# Altium footprint library con-samtec.PCBLIB: 805 footprints (part 7 of 55)
Each footprint in its own frame and in the unit in brackets; x right, y up, seen from the top. Pads: shape width x height; smd on the part's side, far side on the other; paste and mask are expansions set on the pad; w line width, h text height; cw(c..) or ccw(c..) is an arc to the next point about the centre after c.
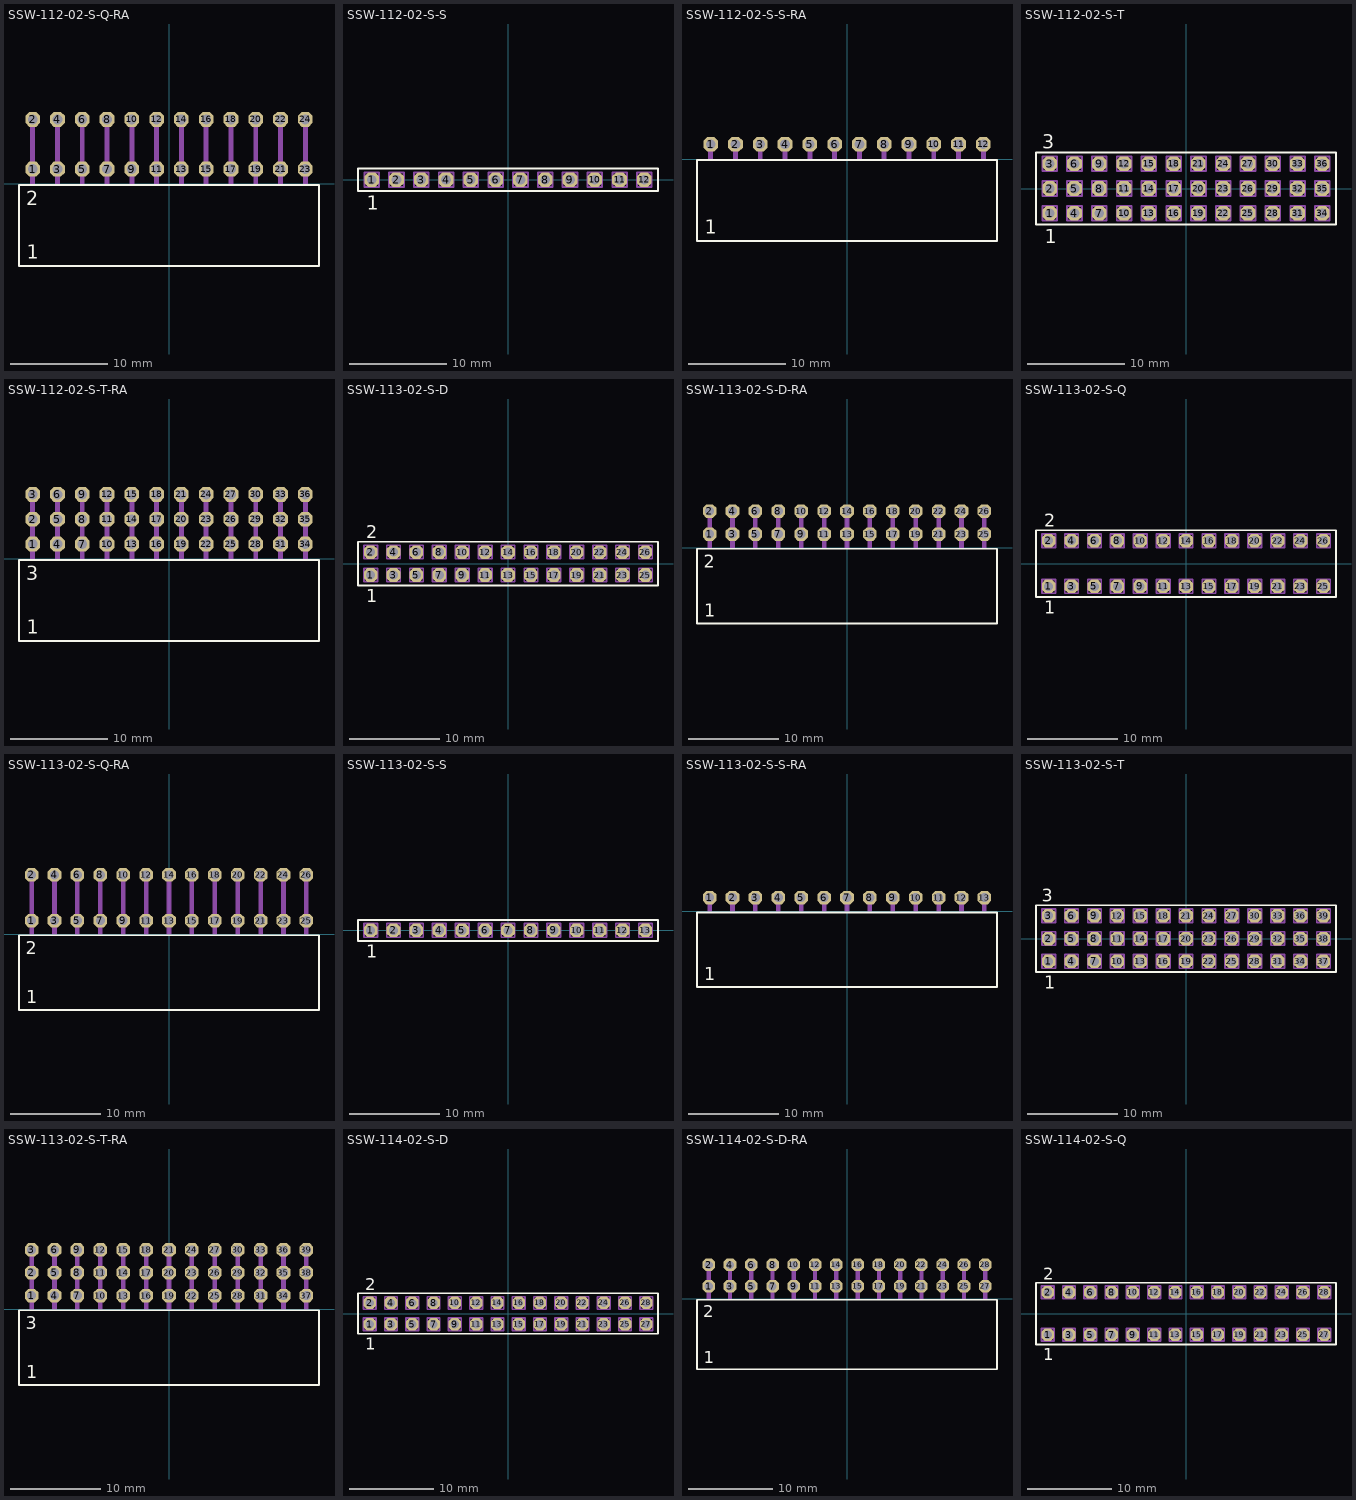
[diagram p6: the footprints below, top view; thin cyan lines are the x and y axes]

## SSW-112-02-S-Q-RA [mil]
pads (24):
  oct 59.06x59.06 hole 39.37: 1(-550,60) 2(-550,260) 3(-450,60) 4(-450,260) 5(-350,60) 6(-350,260) 7(-250,60) 8(-250,260) 9(-150,60) 10(-150,260) 11(-50,60) 12(-50,260) 13(50,60) 14(50,260) 15(150,60) 16(150,260) 17(250,60) 18(250,260) 19(350,60) 20(350,260) 21(450,60) 22(450,260) 23(550,60) 24(550,260)
Top Overlay:
  lines w8: -605.08,-330.55 605.08,-330.55 605.08,-4.17 -605.08,-4.17 -605.08,-330.55
  text "1" at -573.43,-301.18 h56.1
  text "2" at -576.38,-86.61 h56.1
Mechanical 16:
  rectangle: -560,0 -540,270
  rectangle: -460,0 -440,270
  rectangle: -360,0 -340,270
  rectangle: -260,0 -240,270
  rectangle: -160,0 -140,270
  rectangle: -60,0 -40,270
  rectangle: 40,0 60,270
  rectangle: 140,0 160,270
  rectangle: 240,0 260,270
  rectangle: 340,0 360,270
  rectangle: 440,0 460,270
  rectangle: 540,0 560,270

## SSW-112-02-S-S [mm]
pads (12):
  oct 1.5x1.5 hole 1: 1(-13.97,0) 2(-11.43,0) 3(-8.89,0) 4(-6.35,0) 5(-3.81,0) 6(-1.27,0) 7(1.27,0) 8(3.81,0) 9(6.35,0) 10(8.89,0) 11(11.43,0) 12(13.97,0)
Top Overlay:
  lines w0.203: -15.369,-1.155 15.369,-1.155 15.369,1.155 -15.369,1.155 -15.369,-1.155
  text "1" at -14.478,-3.048 h1.42
Mechanical 16:
  lines w0.203: -14.715,-0.745 -13.215,-0.745 -13.215,0.755 -14.715,0.755 -14.715,-0.745 ; -12.175,-0.745 -10.675,-0.745 -10.675,0.755 -12.175,0.755 -12.175,-0.745 ; -9.635,-0.745 -8.135,-0.745 -8.135,0.755 -9.635,0.755 -9.635,-0.745 ; -7.095,-0.745 -5.595,-0.745 -5.595,0.755 -7.095,0.755 -7.095,-0.745 ; -4.555,-0.745 -3.055,-0.745 -3.055,0.755 -4.555,0.755 -4.555,-0.745 ; -2.015,-0.745 -0.515,-0.745 -0.515,0.755 -2.015,0.755 -2.015,-0.745 ; 0.525,-0.745 2.025,-0.745 2.025,0.755 0.525,0.755 0.525,-0.745 ; 3.065,-0.745 4.565,-0.745 4.565,0.755 3.065,0.755 3.065,-0.745 ; 5.605,-0.745 7.105,-0.745 7.105,0.755 5.605,0.755 5.605,-0.745 ; 8.145,-0.745 9.645,-0.745 9.645,0.755 8.145,0.755 8.145,-0.745 ; 10.685,-0.745 12.185,-0.745 12.185,0.755 10.685,0.755 10.685,-0.745 ; 13.225,-0.745 14.725,-0.745 14.725,0.755 13.225,0.755 13.225,-0.745

## SSW-112-02-S-S-RA [mil]
pads (12):
  oct 59.06x59.06 hole 39.37: 1(-550,60) 2(-450,60) 3(-350,60) 4(-250,60) 5(-150,60) 6(-50,60) 7(50,60) 8(150,60) 9(250,60) 10(350,60) 11(450,60) 12(550,60)
Top Overlay:
  lines w8: -605.08,-330.55 605.08,-330.55 605.08,-4.17 -605.08,-4.17 -605.08,-330.55
  text "1" at -573.43,-301.18 h56.1
Mechanical 16:
  rectangle: -560,0 -540,70
  rectangle: -460,0 -440,70
  rectangle: -360,0 -340,70
  rectangle: -260,0 -240,70
  rectangle: -160,0 -140,70
  rectangle: -60,0 -40,70
  rectangle: 40,0 60,70
  rectangle: 140,0 160,70
  rectangle: 240,0 260,70
  rectangle: 340,0 360,70
  rectangle: 440,0 460,70
  rectangle: 540,0 560,70

## SSW-112-02-S-T [mm]
pads (36):
  oct 1.5x1.5 hole 1: 1(-13.97,-2.54) 2(-13.97,0) 3(-13.97,2.54) 4(-11.43,-2.54) 5(-11.43,0) 6(-11.43,2.54) 7(-8.89,-2.54) 8(-8.89,0) 9(-8.89,2.54) 10(-6.35,-2.54) 11(-6.35,0) 12(-6.35,2.54) 13(-3.81,-2.54) 14(-3.81,0) 15(-3.81,2.54) 16(-1.27,-2.54) 17(-1.27,0) 18(-1.27,2.54) 19(1.27,-2.54) 20(1.27,0) 21(1.27,2.54) 22(3.81,-2.54) 23(3.81,0) 24(3.81,2.54) 25(6.35,-2.54) 26(6.35,0) 27(6.35,2.54) 28(8.89,-2.54) 29(8.89,0) 30(8.89,2.54) 31(11.43,-2.54) 32(11.43,0) 33(11.43,2.54) 34(13.97,-2.54) 35(13.97,0) 36(13.97,2.54)
Top Overlay:
  lines w0.203: -15.369,-3.695 15.369,-3.695 15.369,3.695 -15.369,3.695 -15.369,-3.695
  text "1" at -14.478,-5.588 h1.42
  text "3" at -14.732,4.064 h1.42
Mechanical 16:
  lines w0.203: -14.715,-3.285 -13.215,-3.285 -13.215,-1.785 -14.715,-1.785 -14.715,-3.285 ; -14.715,-0.745 -13.215,-0.745 -13.215,0.755 -14.715,0.755 -14.715,-0.745 ; -14.715,1.795 -13.215,1.795 -13.215,3.295 -14.715,3.295 -14.715,1.795 ; -12.175,-3.285 -10.675,-3.285 -10.675,-1.785 -12.175,-1.785 -12.175,-3.285 ; -12.175,-0.745 -10.675,-0.745 -10.675,0.755 -12.175,0.755 -12.175,-0.745 ; -12.175,1.795 -10.675,1.795 -10.675,3.295 -12.175,3.295 -12.175,1.795 ; -9.635,-3.285 -8.135,-3.285 -8.135,-1.785 -9.635,-1.785 -9.635,-3.285 ; -9.635,-0.745 -8.135,-0.745 -8.135,0.755 -9.635,0.755 -9.635,-0.745 ; -9.635,1.795 -8.135,1.795 -8.135,3.295 -9.635,3.295 -9.635,1.795 ; -7.095,-3.285 -5.595,-3.285 -5.595,-1.785 -7.095,-1.785 -7.095,-3.285 ; -7.095,-0.745 -5.595,-0.745 -5.595,0.755 -7.095,0.755 -7.095,-0.745 ; -7.095,1.795 -5.595,1.795 -5.595,3.295 -7.095,3.295 -7.095,1.795 ; -4.555,-3.285 -3.055,-3.285 -3.055,-1.785 -4.555,-1.785 -4.555,-3.285 ; -4.555,-0.745 -3.055,-0.745 -3.055,0.755 -4.555,0.755 -4.555,-0.745 ; -4.555,1.795 -3.055,1.795 -3.055,3.295 -4.555,3.295 -4.555,1.795 ; -2.015,-3.285 -0.515,-3.285 -0.515,-1.785 -2.015,-1.785 -2.015,-3.285 ; -2.015,-0.745 -0.515,-0.745 -0.515,0.755 -2.015,0.755 -2.015,-0.745 ; -2.015,1.795 -0.515,1.795 -0.515,3.295 -2.015,3.295 -2.015,1.795 ; 0.525,-3.285 2.025,-3.285 2.025,-1.785 0.525,-1.785 0.525,-3.285 ; 0.525,-0.745 2.025,-0.745 2.025,0.755 0.525,0.755 0.525,-0.745 ; 0.525,1.795 2.025,1.795 2.025,3.295 0.525,3.295 0.525,1.795 ; 3.065,-3.285 4.565,-3.285 4.565,-1.785 3.065,-1.785 3.065,-3.285 ; 3.065,-0.745 4.565,-0.745 4.565,0.755 3.065,0.755 3.065,-0.745 ; 3.065,1.795 4.565,1.795 4.565,3.295 3.065,3.295 3.065,1.795 ; 5.605,-3.285 7.105,-3.285 7.105,-1.785 5.605,-1.785 5.605,-3.285 ; 5.605,-0.745 7.105,-0.745 7.105,0.755 5.605,0.755 5.605,-0.745 ; 5.605,1.795 7.105,1.795 7.105,3.295 5.605,3.295 5.605,1.795 ; 8.145,-3.285 9.645,-3.285 9.645,-1.785 8.145,-1.785 8.145,-3.285 ; 8.145,-0.745 9.645,-0.745 9.645,0.755 8.145,0.755 8.145,-0.745 ; 8.145,1.795 9.645,1.795 9.645,3.295 8.145,3.295 8.145,1.795 ; 10.685,-3.285 12.185,-3.285 12.185,-1.785 10.685,-1.785 10.685,-3.285 ; 10.685,-0.745 12.185,-0.745 12.185,0.755 10.685,0.755 10.685,-0.745 ; 10.685,1.795 12.185,1.795 12.185,3.295 10.685,3.295 10.685,1.795 ; 13.225,-3.285 14.725,-3.285 14.725,-1.785 13.225,-1.785 13.225,-3.285 ; 13.225,-0.745 14.725,-0.745 14.725,0.755 13.225,0.755 13.225,-0.745 ; 13.225,1.795 14.725,1.795 14.725,3.295 13.225,3.295 13.225,1.795

## SSW-112-02-S-T-RA [mil]
pads (36):
  oct 59.06x59.06 hole 39.37: 1(-550,60) 2(-550,160) 3(-550,260) 4(-450,60) 5(-450,160) 6(-450,260) 7(-350,60) 8(-350,160) 9(-350,260) 10(-250,60) 11(-250,160) 12(-250,260) 13(-150,60) 14(-150,160) 15(-150,260) 16(-50,60) 17(-50,160) 18(-50,260) 19(50,60) 20(50,160) 21(50,260) 22(150,60) 23(150,160) 24(150,260) 25(250,60) 26(250,160) 27(250,260) 28(350,60) 29(350,160) 30(350,260) 31(450,60) 32(450,160) 33(450,260) 34(550,60) 35(550,160) 36(550,260)
Top Overlay:
  lines w8: -605.08,-330.55 605.08,-330.55 605.08,-4.17 -605.08,-4.17 -605.08,-330.55
  text "1" at -573.43,-301.18 h56.1
  text "3" at -576.38,-86.61 h56.1
Mechanical 16:
  rectangle: -560,0 -540,270
  rectangle: -460,0 -440,270
  rectangle: -360,0 -340,270
  rectangle: -260,0 -240,270
  rectangle: -160,0 -140,270
  rectangle: -60,0 -40,270
  rectangle: 40,0 60,270
  rectangle: 140,0 160,270
  rectangle: 240,0 260,270
  rectangle: 340,0 360,270
  rectangle: 440,0 460,270
  rectangle: 540,0 560,270

## SSW-113-02-S-D [mm]
pads (26):
  oct 1.5x1.5 hole 1: 1(-15.24,-1.27) 2(-15.24,1.27) 3(-12.7,-1.27) 4(-12.7,1.27) 5(-10.16,-1.27) 6(-10.16,1.27) 7(-7.62,-1.27) 8(-7.62,1.27) 9(-5.08,-1.27) 10(-5.08,1.27) 11(-2.54,-1.27) 12(-2.54,1.27) 13(0,-1.27) 14(0,1.27) 15(2.54,-1.27) 16(2.54,1.27) 17(5.08,-1.27) 18(5.08,1.27) 19(7.62,-1.27) 20(7.62,1.27) 21(10.16,-1.27) 22(10.16,1.27) 23(12.7,-1.27) 24(12.7,1.27) 25(15.24,-1.27) 26(15.24,1.27)
Top Overlay:
  lines w0.203: -16.639,-2.425 16.639,-2.425 16.639,2.425 -16.639,2.425 -16.639,-2.425
  text "1" at -15.748,-4.318 h1.42
  text "2" at -15.748,2.794 h1.42
Mechanical 16:
  lines w0.203: -15.985,-2.015 -14.485,-2.015 -14.485,-0.515 -15.985,-0.515 -15.985,-2.015 ; -15.985,0.525 -14.485,0.525 -14.485,2.025 -15.985,2.025 -15.985,0.525 ; -13.445,-2.015 -11.945,-2.015 -11.945,-0.515 -13.445,-0.515 -13.445,-2.015 ; -13.445,0.525 -11.945,0.525 -11.945,2.025 -13.445,2.025 -13.445,0.525 ; -10.905,-2.015 -9.405,-2.015 -9.405,-0.515 -10.905,-0.515 -10.905,-2.015 ; -10.905,0.525 -9.405,0.525 -9.405,2.025 -10.905,2.025 -10.905,0.525 ; -8.365,-2.015 -6.865,-2.015 -6.865,-0.515 -8.365,-0.515 -8.365,-2.015 ; -8.365,0.525 -6.865,0.525 -6.865,2.025 -8.365,2.025 -8.365,0.525 ; -5.825,-2.015 -4.325,-2.015 -4.325,-0.515 -5.825,-0.515 -5.825,-2.015 ; -5.825,0.525 -4.325,0.525 -4.325,2.025 -5.825,2.025 -5.825,0.525 ; -3.285,-2.015 -1.785,-2.015 -1.785,-0.515 -3.285,-0.515 -3.285,-2.015 ; -3.285,0.525 -1.785,0.525 -1.785,2.025 -3.285,2.025 -3.285,0.525 ; -0.745,-2.015 0.755,-2.015 0.755,-0.515 -0.745,-0.515 -0.745,-2.015 ; -0.745,0.525 0.755,0.525 0.755,2.025 -0.745,2.025 -0.745,0.525 ; 1.795,-2.015 3.295,-2.015 3.295,-0.515 1.795,-0.515 1.795,-2.015 ; 1.795,0.525 3.295,0.525 3.295,2.025 1.795,2.025 1.795,0.525 ; 4.335,-2.015 5.835,-2.015 5.835,-0.515 4.335,-0.515 4.335,-2.015 ; 4.335,0.525 5.835,0.525 5.835,2.025 4.335,2.025 4.335,0.525 ; 6.875,-2.015 8.375,-2.015 8.375,-0.515 6.875,-0.515 6.875,-2.015 ; 6.875,0.525 8.375,0.525 8.375,2.025 6.875,2.025 6.875,0.525 ; 9.415,-2.015 10.915,-2.015 10.915,-0.515 9.415,-0.515 9.415,-2.015 ; 9.415,0.525 10.915,0.525 10.915,2.025 9.415,2.025 9.415,0.525 ; 11.955,-2.015 13.455,-2.015 13.455,-0.515 11.955,-0.515 11.955,-2.015 ; 11.955,0.525 13.455,0.525 13.455,2.025 11.955,2.025 11.955,0.525 ; 14.495,-2.015 15.995,-2.015 15.995,-0.515 14.495,-0.515 14.495,-2.015 ; 14.495,0.525 15.995,0.525 15.995,2.025 14.495,2.025 14.495,0.525

## SSW-113-02-S-D-RA [mil]
pads (26):
  oct 59.06x59.06 hole 39.37: 1(-600,60) 2(-600,160) 3(-500,60) 4(-500,160) 5(-400,60) 6(-400,160) 7(-300,60) 8(-300,160) 9(-200,60) 10(-200,160) 11(-100,60) 12(-100,160) 13(0,60) 14(0,160) 15(100,60) 16(100,160) 17(200,60) 18(200,160) 19(300,60) 20(300,160) 21(400,60) 22(400,160) 23(500,60) 24(500,160) 25(600,60) 26(600,160)
Top Overlay:
  lines w8: -655.08,-330.55 655.08,-330.55 655.08,-4.17 -655.08,-4.17 -655.08,-330.55
  text "1" at -623.43,-301.18 h56.1
  text "2" at -626.38,-86.61 h56.1
Mechanical 16:
  rectangle: -610,0 -590,170
  rectangle: -510,0 -490,170
  rectangle: -410,0 -390,170
  rectangle: -310,0 -290,170
  rectangle: -210,0 -190,170
  rectangle: -110,0 -90,170
  rectangle: -10,0 10,170
  rectangle: 90,0 110,170
  rectangle: 190,0 210,170
  rectangle: 290,0 310,170
  rectangle: 390,0 410,170
  rectangle: 490,0 510,170
  rectangle: 590,0 610,170

## SSW-113-02-S-Q [mm]
pads (26):
  oct 1.5x1.5 hole 1: 1(-15.24,-2.54) 2(-15.24,2.54) 3(-12.7,-2.54) 4(-12.7,2.54) 5(-10.16,-2.54) 6(-10.16,2.54) 7(-7.62,-2.54) 8(-7.62,2.54) 9(-5.08,-2.54) 10(-5.08,2.54) 11(-2.54,-2.54) 12(-2.54,2.54) 13(0,-2.54) 14(0,2.54) 15(2.54,-2.54) 16(2.54,2.54) 17(5.08,-2.54) 18(5.08,2.54) 19(7.62,-2.54) 20(7.62,2.54) 21(10.16,-2.54) 22(10.16,2.54) 23(12.7,-2.54) 24(12.7,2.54) 25(15.24,-2.54) 26(15.24,2.54)
Top Overlay:
  lines w0.203: -16.639,-3.695 16.639,-3.695 16.639,3.695 -16.639,3.695 -16.639,-3.695
  text "1" at -15.748,-5.588 h1.42
  text "2" at -15.748,4.064 h1.42
Mechanical 16:
  lines w0.203: -15.985,-3.285 -14.485,-3.285 -14.485,-1.785 -15.985,-1.785 -15.985,-3.285 ; -15.985,1.795 -14.485,1.795 -14.485,3.295 -15.985,3.295 -15.985,1.795 ; -13.445,-3.285 -11.945,-3.285 -11.945,-1.785 -13.445,-1.785 -13.445,-3.285 ; -13.445,1.795 -11.945,1.795 -11.945,3.295 -13.445,3.295 -13.445,1.795 ; -10.905,-3.285 -9.405,-3.285 -9.405,-1.785 -10.905,-1.785 -10.905,-3.285 ; -10.905,1.795 -9.405,1.795 -9.405,3.295 -10.905,3.295 -10.905,1.795 ; -8.365,-3.285 -6.865,-3.285 -6.865,-1.785 -8.365,-1.785 -8.365,-3.285 ; -8.365,1.795 -6.865,1.795 -6.865,3.295 -8.365,3.295 -8.365,1.795 ; -5.825,-3.285 -4.325,-3.285 -4.325,-1.785 -5.825,-1.785 -5.825,-3.285 ; -5.825,1.795 -4.325,1.795 -4.325,3.295 -5.825,3.295 -5.825,1.795 ; -3.285,-3.285 -1.785,-3.285 -1.785,-1.785 -3.285,-1.785 -3.285,-3.285 ; -3.285,1.795 -1.785,1.795 -1.785,3.295 -3.285,3.295 -3.285,1.795 ; -0.745,-3.285 0.755,-3.285 0.755,-1.785 -0.745,-1.785 -0.745,-3.285 ; -0.745,1.795 0.755,1.795 0.755,3.295 -0.745,3.295 -0.745,1.795 ; 1.795,-3.285 3.295,-3.285 3.295,-1.785 1.795,-1.785 1.795,-3.285 ; 1.795,1.795 3.295,1.795 3.295,3.295 1.795,3.295 1.795,1.795 ; 4.335,-3.285 5.835,-3.285 5.835,-1.785 4.335,-1.785 4.335,-3.285 ; 4.335,1.795 5.835,1.795 5.835,3.295 4.335,3.295 4.335,1.795 ; 6.875,-3.285 8.375,-3.285 8.375,-1.785 6.875,-1.785 6.875,-3.285 ; 6.875,1.795 8.375,1.795 8.375,3.295 6.875,3.295 6.875,1.795 ; 9.415,-3.285 10.915,-3.285 10.915,-1.785 9.415,-1.785 9.415,-3.285 ; 9.415,1.795 10.915,1.795 10.915,3.295 9.415,3.295 9.415,1.795 ; 11.955,-3.285 13.455,-3.285 13.455,-1.785 11.955,-1.785 11.955,-3.285 ; 11.955,1.795 13.455,1.795 13.455,3.295 11.955,3.295 11.955,1.795 ; 14.495,-3.285 15.995,-3.285 15.995,-1.785 14.495,-1.785 14.495,-3.285 ; 14.495,1.795 15.995,1.795 15.995,3.295 14.495,3.295 14.495,1.795

## SSW-113-02-S-Q-RA [mil]
pads (26):
  oct 59.06x59.06 hole 39.37: 1(-600,60) 2(-600,260) 3(-500,60) 4(-500,260) 5(-400,60) 6(-400,260) 7(-300,60) 8(-300,260) 9(-200,60) 10(-200,260) 11(-100,60) 12(-100,260) 13(0,60) 14(0,260) 15(100,60) 16(100,260) 17(200,60) 18(200,260) 19(300,60) 20(300,260) 21(400,60) 22(400,260) 23(500,60) 24(500,260) 25(600,60) 26(600,260)
Top Overlay:
  lines w8: -655.08,-330.55 655.08,-330.55 655.08,-4.17 -655.08,-4.17 -655.08,-330.55
  text "1" at -623.43,-301.18 h56.1
  text "2" at -626.38,-86.61 h56.1
Mechanical 16:
  rectangle: -610,0 -590,270
  rectangle: -510,0 -490,270
  rectangle: -410,0 -390,270
  rectangle: -310,0 -290,270
  rectangle: -210,0 -190,270
  rectangle: -110,0 -90,270
  rectangle: -10,0 10,270
  rectangle: 90,0 110,270
  rectangle: 190,0 210,270
  rectangle: 290,0 310,270
  rectangle: 390,0 410,270
  rectangle: 490,0 510,270
  rectangle: 590,0 610,270

## SSW-113-02-S-S [mm]
pads (13):
  oct 1.5x1.5 hole 1: 1(-15.24,0) 2(-12.7,0) 3(-10.16,0) 4(-7.62,0) 5(-5.08,0) 6(-2.54,0) 7(0,0) 8(2.54,0) 9(5.08,0) 10(7.62,0) 11(10.16,0) 12(12.7,0) 13(15.24,0)
Top Overlay:
  lines w0.203: -16.639,-1.155 16.639,-1.155 16.639,1.155 -16.639,1.155 -16.639,-1.155
  text "1" at -15.748,-3.048 h1.42
Mechanical 16:
  lines w0.203: -15.985,-0.745 -14.485,-0.745 -14.485,0.755 -15.985,0.755 -15.985,-0.745 ; -13.445,-0.745 -11.945,-0.745 -11.945,0.755 -13.445,0.755 -13.445,-0.745 ; -10.905,-0.745 -9.405,-0.745 -9.405,0.755 -10.905,0.755 -10.905,-0.745 ; -8.365,-0.745 -6.865,-0.745 -6.865,0.755 -8.365,0.755 -8.365,-0.745 ; -5.825,-0.745 -4.325,-0.745 -4.325,0.755 -5.825,0.755 -5.825,-0.745 ; -3.285,-0.745 -1.785,-0.745 -1.785,0.755 -3.285,0.755 -3.285,-0.745 ; -0.745,-0.745 0.755,-0.745 0.755,0.755 -0.745,0.755 -0.745,-0.745 ; 1.795,-0.745 3.295,-0.745 3.295,0.755 1.795,0.755 1.795,-0.745 ; 4.335,-0.745 5.835,-0.745 5.835,0.755 4.335,0.755 4.335,-0.745 ; 6.875,-0.745 8.375,-0.745 8.375,0.755 6.875,0.755 6.875,-0.745 ; 9.415,-0.745 10.915,-0.745 10.915,0.755 9.415,0.755 9.415,-0.745 ; 11.955,-0.745 13.455,-0.745 13.455,0.755 11.955,0.755 11.955,-0.745 ; 14.495,-0.745 15.995,-0.745 15.995,0.755 14.495,0.755 14.495,-0.745

## SSW-113-02-S-S-RA [mil]
pads (13):
  oct 59.06x59.06 hole 39.37: 1(-600,60) 2(-500,60) 3(-400,60) 4(-300,60) 5(-200,60) 6(-100,60) 7(0,60) 8(100,60) 9(200,60) 10(300,60) 11(400,60) 12(500,60) 13(600,60)
Top Overlay:
  lines w8: -655.08,-330.55 655.08,-330.55 655.08,-4.17 -655.08,-4.17 -655.08,-330.55
  text "1" at -623.43,-301.18 h56.1
Mechanical 16:
  rectangle: -610,0 -590,70
  rectangle: -510,0 -490,70
  rectangle: -410,0 -390,70
  rectangle: -310,0 -290,70
  rectangle: -210,0 -190,70
  rectangle: -110,0 -90,70
  rectangle: -10,0 10,70
  rectangle: 90,0 110,70
  rectangle: 190,0 210,70
  rectangle: 290,0 310,70
  rectangle: 390,0 410,70
  rectangle: 490,0 510,70
  rectangle: 590,0 610,70

## SSW-113-02-S-T [mm]
pads (39):
  oct 1.5x1.5 hole 1: 1(-15.24,-2.54) 2(-15.24,0) 3(-15.24,2.54) 4(-12.7,-2.54) 5(-12.7,0) 6(-12.7,2.54) 7(-10.16,-2.54) 8(-10.16,0) 9(-10.16,2.54) 10(-7.62,-2.54) 11(-7.62,0) 12(-7.62,2.54) 13(-5.08,-2.54) 14(-5.08,0) 15(-5.08,2.54) 16(-2.54,-2.54) 17(-2.54,0) 18(-2.54,2.54) 19(0,-2.54) 20(0,0) 21(0,2.54) 22(2.54,-2.54) 23(2.54,0) 24(2.54,2.54) 25(5.08,-2.54) 26(5.08,0) 27(5.08,2.54) 28(7.62,-2.54) 29(7.62,0) 30(7.62,2.54) 31(10.16,-2.54) 32(10.16,0) 33(10.16,2.54) 34(12.7,-2.54) 35(12.7,0) 36(12.7,2.54) 37(15.24,-2.54) 38(15.24,0) 39(15.24,2.54)
Top Overlay:
  lines w0.203: -16.639,-3.695 16.639,-3.695 16.639,3.695 -16.639,3.695 -16.639,-3.695
  text "1" at -15.748,-5.588 h1.42
  text "3" at -16.002,4.064 h1.42
Mechanical 16:
  drawing of 156 lines, arcs and shapes, not listed

## SSW-113-02-S-T-RA [mil]
pads (39):
  oct 59.06x59.06 hole 39.37: 1(-600,60) 2(-600,160) 3(-600,260) 4(-500,60) 5(-500,160) 6(-500,260) 7(-400,60) 8(-400,160) 9(-400,260) 10(-300,60) 11(-300,160) 12(-300,260) 13(-200,60) 14(-200,160) 15(-200,260) 16(-100,60) 17(-100,160) 18(-100,260) 19(0,60) 20(0,160) 21(0,260) 22(100,60) 23(100,160) 24(100,260) 25(200,60) 26(200,160) 27(200,260) 28(300,60) 29(300,160) 30(300,260) 31(400,60) 32(400,160) 33(400,260) 34(500,60) 35(500,160) 36(500,260) 37(600,60) 38(600,160) 39(600,260)
Top Overlay:
  lines w8: -655.08,-330.55 655.08,-330.55 655.08,-4.17 -655.08,-4.17 -655.08,-330.55
  text "1" at -623.43,-301.18 h56.1
  text "3" at -626.38,-86.61 h56.1
Mechanical 16:
  rectangle: -610,0 -590,270
  rectangle: -510,0 -490,270
  rectangle: -410,0 -390,270
  rectangle: -310,0 -290,270
  rectangle: -210,0 -190,270
  rectangle: -110,0 -90,270
  rectangle: -10,0 10,270
  rectangle: 90,0 110,270
  rectangle: 190,0 210,270
  rectangle: 290,0 310,270
  rectangle: 390,0 410,270
  rectangle: 490,0 510,270
  rectangle: 590,0 610,270

## SSW-114-02-S-D [mm]
pads (28):
  oct 1.5x1.5 hole 1: 1(-16.51,-1.27) 2(-16.51,1.27) 3(-13.97,-1.27) 4(-13.97,1.27) 5(-11.43,-1.27) 6(-11.43,1.27) 7(-8.89,-1.27) 8(-8.89,1.27) 9(-6.35,-1.27) 10(-6.35,1.27) 11(-3.81,-1.27) 12(-3.81,1.27) 13(-1.27,-1.27) 14(-1.27,1.27) 15(1.27,-1.27) 16(1.27,1.27) 17(3.81,-1.27) 18(3.81,1.27) 19(6.35,-1.27) 20(6.35,1.27) 21(8.89,-1.27) 22(8.89,1.27) 23(11.43,-1.27) 24(11.43,1.27) 25(13.97,-1.27) 26(13.97,1.27) 27(16.51,-1.27) 28(16.51,1.27)
Top Overlay:
  lines w0.203: -17.909,-2.425 17.909,-2.425 17.909,2.425 -17.909,2.425 -17.909,-2.425
  text "1" at -17.018,-4.318 h1.42
  text "2" at -17.018,2.794 h1.42
Mechanical 16:
  lines w0.203: -17.255,-2.015 -15.755,-2.015 -15.755,-0.515 -17.255,-0.515 -17.255,-2.015 ; -17.255,0.525 -15.755,0.525 -15.755,2.025 -17.255,2.025 -17.255,0.525 ; -14.715,-2.015 -13.215,-2.015 -13.215,-0.515 -14.715,-0.515 -14.715,-2.015 ; -14.715,0.525 -13.215,0.525 -13.215,2.025 -14.715,2.025 -14.715,0.525 ; -12.175,-2.015 -10.675,-2.015 -10.675,-0.515 -12.175,-0.515 -12.175,-2.015 ; -12.175,0.525 -10.675,0.525 -10.675,2.025 -12.175,2.025 -12.175,0.525 ; -9.635,-2.015 -8.135,-2.015 -8.135,-0.515 -9.635,-0.515 -9.635,-2.015 ; -9.635,0.525 -8.135,0.525 -8.135,2.025 -9.635,2.025 -9.635,0.525 ; -7.095,-2.015 -5.595,-2.015 -5.595,-0.515 -7.095,-0.515 -7.095,-2.015 ; -7.095,0.525 -5.595,0.525 -5.595,2.025 -7.095,2.025 -7.095,0.525 ; -4.555,-2.015 -3.055,-2.015 -3.055,-0.515 -4.555,-0.515 -4.555,-2.015 ; -4.555,0.525 -3.055,0.525 -3.055,2.025 -4.555,2.025 -4.555,0.525 ; -2.015,-2.015 -0.515,-2.015 -0.515,-0.515 -2.015,-0.515 -2.015,-2.015 ; -2.015,0.525 -0.515,0.525 -0.515,2.025 -2.015,2.025 -2.015,0.525 ; 0.525,-2.015 2.025,-2.015 2.025,-0.515 0.525,-0.515 0.525,-2.015 ; 0.525,0.525 2.025,0.525 2.025,2.025 0.525,2.025 0.525,0.525 ; 3.065,-2.015 4.565,-2.015 4.565,-0.515 3.065,-0.515 3.065,-2.015 ; 3.065,0.525 4.565,0.525 4.565,2.025 3.065,2.025 3.065,0.525 ; 5.605,-2.015 7.105,-2.015 7.105,-0.515 5.605,-0.515 5.605,-2.015 ; 5.605,0.525 7.105,0.525 7.105,2.025 5.605,2.025 5.605,0.525 ; 8.145,-2.015 9.645,-2.015 9.645,-0.515 8.145,-0.515 8.145,-2.015 ; 8.145,0.525 9.645,0.525 9.645,2.025 8.145,2.025 8.145,0.525 ; 10.685,-2.015 12.185,-2.015 12.185,-0.515 10.685,-0.515 10.685,-2.015 ; 10.685,0.525 12.185,0.525 12.185,2.025 10.685,2.025 10.685,0.525 ; 13.225,-2.015 14.725,-2.015 14.725,-0.515 13.225,-0.515 13.225,-2.015 ; 13.225,0.525 14.725,0.525 14.725,2.025 13.225,2.025 13.225,0.525 ; 15.765,-2.015 17.265,-2.015 17.265,-0.515 15.765,-0.515 15.765,-2.015 ; 15.765,0.525 17.265,0.525 17.265,2.025 15.765,2.025 15.765,0.525

## SSW-114-02-S-D-RA [mil]
pads (28):
  oct 59.06x59.06 hole 39.37: 1(-650,60) 2(-650,160) 3(-550,60) 4(-550,160) 5(-450,60) 6(-450,160) 7(-350,60) 8(-350,160) 9(-250,60) 10(-250,160) 11(-150,60) 12(-150,160) 13(-50,60) 14(-50,160) 15(50,60) 16(50,160) 17(150,60) 18(150,160) 19(250,60) 20(250,160) 21(350,60) 22(350,160) 23(450,60) 24(450,160) 25(550,60) 26(550,160) 27(650,60) 28(650,160)
Top Overlay:
  lines w8: -705.08,-330.55 705.08,-330.55 705.08,-4.17 -705.08,-4.17 -705.08,-330.55
  text "1" at -673.43,-301.18 h56.1
  text "2" at -676.38,-86.61 h56.1
Mechanical 16:
  rectangle: -660,0 -640,170
  rectangle: -560,0 -540,170
  rectangle: -460,0 -440,170
  rectangle: -360,0 -340,170
  rectangle: -260,0 -240,170
  rectangle: -160,0 -140,170
  rectangle: -60,0 -40,170
  rectangle: 40,0 60,170
  rectangle: 140,0 160,170
  rectangle: 240,0 260,170
  rectangle: 340,0 360,170
  rectangle: 440,0 460,170
  rectangle: 540,0 560,170
  rectangle: 640,0 660,170

## SSW-114-02-S-Q [mm]
pads (28):
  oct 1.5x1.5 hole 1: 1(-16.51,-2.54) 2(-16.51,2.54) 3(-13.97,-2.54) 4(-13.97,2.54) 5(-11.43,-2.54) 6(-11.43,2.54) 7(-8.89,-2.54) 8(-8.89,2.54) 9(-6.35,-2.54) 10(-6.35,2.54) 11(-3.81,-2.54) 12(-3.81,2.54) 13(-1.27,-2.54) 14(-1.27,2.54) 15(1.27,-2.54) 16(1.27,2.54) 17(3.81,-2.54) 18(3.81,2.54) 19(6.35,-2.54) 20(6.35,2.54) 21(8.89,-2.54) 22(8.89,2.54) 23(11.43,-2.54) 24(11.43,2.54) 25(13.97,-2.54) 26(13.97,2.54) 27(16.51,-2.54) 28(16.51,2.54)
Top Overlay:
  lines w0.203: -17.909,-3.695 17.909,-3.695 17.909,3.695 -17.909,3.695 -17.909,-3.695
  text "1" at -17.018,-5.588 h1.42
  text "2" at -17.018,4.064 h1.42
Mechanical 16:
  lines w0.203: -17.255,-3.285 -15.755,-3.285 -15.755,-1.785 -17.255,-1.785 -17.255,-3.285 ; -17.255,1.795 -15.755,1.795 -15.755,3.295 -17.255,3.295 -17.255,1.795 ; -14.715,-3.285 -13.215,-3.285 -13.215,-1.785 -14.715,-1.785 -14.715,-3.285 ; -14.715,1.795 -13.215,1.795 -13.215,3.295 -14.715,3.295 -14.715,1.795 ; -12.175,-3.285 -10.675,-3.285 -10.675,-1.785 -12.175,-1.785 -12.175,-3.285 ; -12.175,1.795 -10.675,1.795 -10.675,3.295 -12.175,3.295 -12.175,1.795 ; -9.635,-3.285 -8.135,-3.285 -8.135,-1.785 -9.635,-1.785 -9.635,-3.285 ; -9.635,1.795 -8.135,1.795 -8.135,3.295 -9.635,3.295 -9.635,1.795 ; -7.095,-3.285 -5.595,-3.285 -5.595,-1.785 -7.095,-1.785 -7.095,-3.285 ; -7.095,1.795 -5.595,1.795 -5.595,3.295 -7.095,3.295 -7.095,1.795 ; -4.555,-3.285 -3.055,-3.285 -3.055,-1.785 -4.555,-1.785 -4.555,-3.285 ; -4.555,1.795 -3.055,1.795 -3.055,3.295 -4.555,3.295 -4.555,1.795 ; -2.015,-3.285 -0.515,-3.285 -0.515,-1.785 -2.015,-1.785 -2.015,-3.285 ; -2.015,1.795 -0.515,1.795 -0.515,3.295 -2.015,3.295 -2.015,1.795 ; 0.525,-3.285 2.025,-3.285 2.025,-1.785 0.525,-1.785 0.525,-3.285 ; 0.525,1.795 2.025,1.795 2.025,3.295 0.525,3.295 0.525,1.795 ; 3.065,-3.285 4.565,-3.285 4.565,-1.785 3.065,-1.785 3.065,-3.285 ; 3.065,1.795 4.565,1.795 4.565,3.295 3.065,3.295 3.065,1.795 ; 5.605,-3.285 7.105,-3.285 7.105,-1.785 5.605,-1.785 5.605,-3.285 ; 5.605,1.795 7.105,1.795 7.105,3.295 5.605,3.295 5.605,1.795 ; 8.145,-3.285 9.645,-3.285 9.645,-1.785 8.145,-1.785 8.145,-3.285 ; 8.145,1.795 9.645,1.795 9.645,3.295 8.145,3.295 8.145,1.795 ; 10.685,-3.285 12.185,-3.285 12.185,-1.785 10.685,-1.785 10.685,-3.285 ; 10.685,1.795 12.185,1.795 12.185,3.295 10.685,3.295 10.685,1.795 ; 13.225,-3.285 14.725,-3.285 14.725,-1.785 13.225,-1.785 13.225,-3.285 ; 13.225,1.795 14.725,1.795 14.725,3.295 13.225,3.295 13.225,1.795 ; 15.765,-3.285 17.265,-3.285 17.265,-1.785 15.765,-1.785 15.765,-3.285 ; 15.765,1.795 17.265,1.795 17.265,3.295 15.765,3.295 15.765,1.795